# Altium schematic symbol library 13-Analog D 数模模数.SchLib: 573 symbols (part 5 of 6)
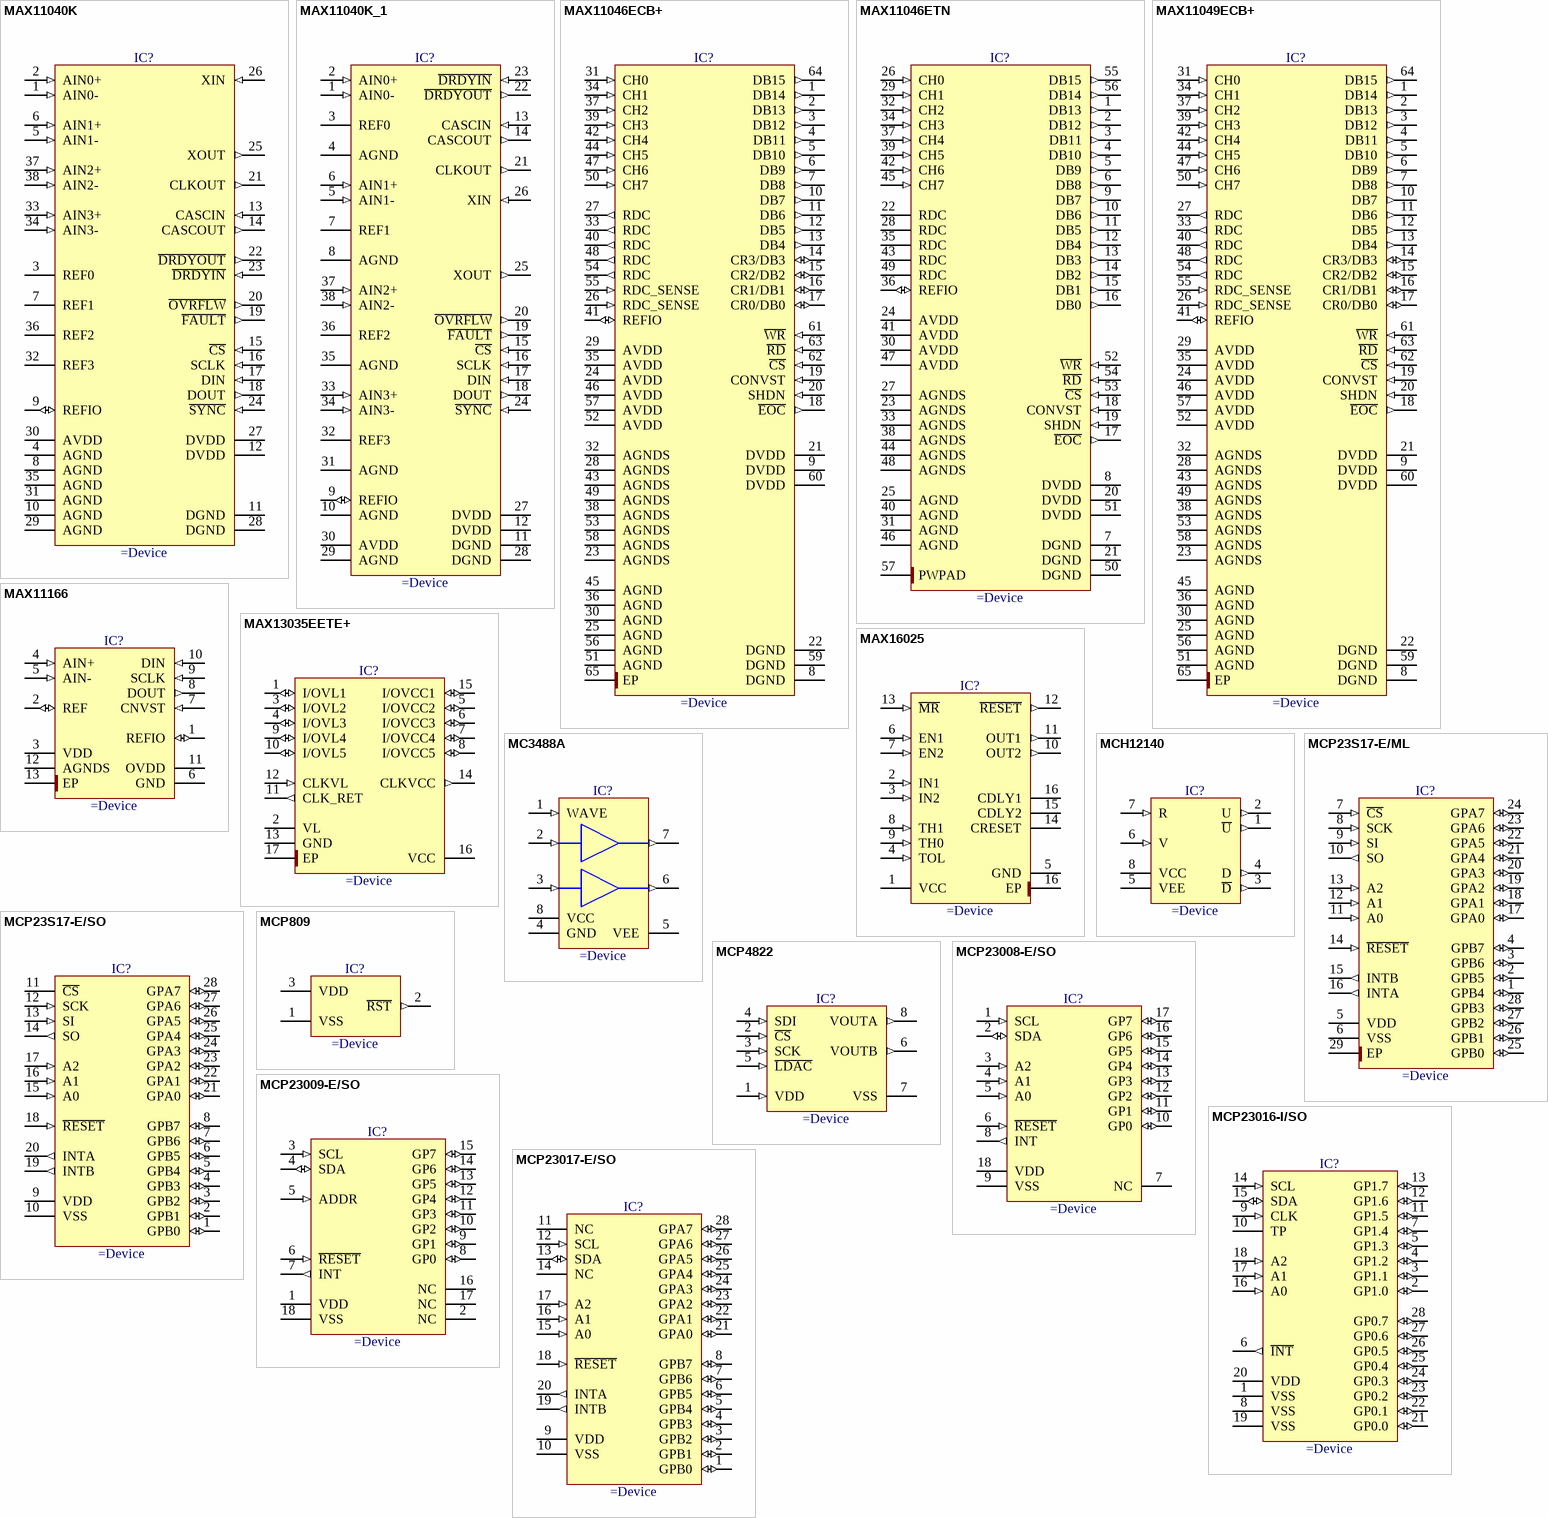
[diagram p44: symbols MAX11040K to MCP23017-E/SO]

## MAX11040K
designator IC?
24-Bit, 4-Channel, Simultaneous-Sampling, Cascadable, Sigma-Delta ADC
pins: 1 AIN0- (in), 2 AIN0+ (in), 3 REF0, 4 AGND (power), 5 AIN1- (in), 6 AIN1+ (in), 7 REF1, 8 AGND (power), 9 REFIO (io), 10 AGND (power), 11 DGND (power), 12 DVDD (power), 13 CASCIN (in), 14 CASCOUT (out), 15 ~{CS} (in), 16 SCLK (in), 17 DIN (in), 18 DOUT (out), 19 ~{FAULT} (out), 20 ~{OVRFLW} (out), 21 CLKOUT (out), 22 ~{DRDYOUT} (out), 23 ~{DRDYIN} (in), 24 ~{SYNC} (in), 25 XOUT (out), 26 XIN (in), 27 DVDD (power), 28 DGND (power), 29 AGND (power), 30 AVDD (power), 31 AGND (power), 32 REF3, 33 AIN3+ (in), 34 AIN3- (in), 35 AGND (power), 36 REF2, 37 AIN2+ (in), 38 AIN2- (in)

## MAX11040K_1
designator IC?
24-Bit, 4-Channel, Simultaneous-Sampling, Cascadable, Sigma-Delta ADC
pins: 1 AIN0- (in), 2 AIN0+ (in), 3 REF0, 4 AGND (power), 5 AIN1- (in), 6 AIN1+ (in), 7 REF1, 8 AGND (power), 9 REFIO (io), 10 AGND (power), 11 DGND (power), 12 DVDD (power), 13 CASCIN (in), 14 CASCOUT (out), 15 ~{CS} (in), 16 SCLK (in), 17 DIN (in), 18 DOUT (out), 19 ~{FAULT} (out), 20 ~{OVRFLW} (out), 21 CLKOUT (out), 22 ~{DRDYOUT} (out), 23 ~{DRDYIN} (in), 24 ~{SYNC} (in), 25 XOUT (out), 26 XIN (in), 27 DVDD (power), 28 DGND (power), 29 AGND (power), 30 AVDD (power), 31 AGND (power), 32 REF3, 33 AIN3+ (in), 34 AIN3- (in), 35 AGND (power), 36 REF2, 37 AIN2+ (in), 38 AIN2- (in)

## MAX11046ECB+
designator IC?
8-Channel, 16-Bit, Simultaneous-Sampling ADC
pins: 1 DB14 (out), 2 DB13 (out), 3 DB12 (out), 4 DB11 (out), 5 DB10 (out), 6 DB9 (out), 7 DB8 (out), 8 DGND (power), 9 DVDD (power), 10 DB7 (out), 11 DB6 (out), 12 DB5 (out), 13 DB4 (out), 14 CR3/DB3 (io), 15 CR2/DB2 (io), 16 CR1/DB1 (io), 17 CR0/DB0 (io), 18 ~{EOC} (out), 19 CONVST (in), 20 SHDN (in), 21 DVDD (power), 22 DGND (power), 23 AGNDS (power), 24 AVDD (power), 25 AGND (power), 26 RDC_SENSE (in), 27 RDC (out), 28 AGNDS (power), 29 AVDD (power), 30 AGND (power), 31 CH0 (in), 32 AGNDS (power), 33 RDC (out), 34 CH1 (in), 35 AVDD (power), 36 AGND (power), 37 CH2 (in), 38 AGNDS (power), 39 CH3 (in), 40 RDC (out), 41 REFIO (io), 42 CH4 (in), 43 AGNDS (power), 44 CH5 (in), 45 AGND (power), 46 AVDD (power), 47 CH6 (in), 48 RDC (out), 49 AGNDS (power), 50 CH7 (in), 51 AGND (power), 52 AVDD (power), 53 AGNDS (power), 54 RDC (out), 55 RDC_SENSE (in), 56 AGND (power), 57 AVDD (power), 58 AGNDS (power), 59 DGND (power), 60 DVDD (power), 61 ~{WR} (in), 62 ~{CS} (in), 63 ~{RD} (in), 64 DB15 (out), 65 EP (power)

## MAX11046ETN
designator IC?
8-Channel, 16-Bit, Simultaneous-Sampling ADC
pins: 1 DB13 (out), 2 DB12 (out), 3 DB11 (out), 4 DB10 (out), 5 DB9 (out), 6 DB8 (out), 7 DGND (power), 8 DVDD (power), 9 DB7 (out), 10 DB6 (out), 11 DB5 (out), 12 DB4 (out), 13 DB3 (out), 14 DB2 (out), 15 DB1 (out), 16 DB0 (out), 17 ~{EOC} (out), 18 CONVST (in), 19 SHDN (in), 20 DVDD (power), 21 DGND (power), 22 RDC, 23 AGNDS (power), 24 AVDD (power), 25 AGND (power), 26 CH0 (in), 27 AGNDS (power), 28 RDC, 29 CH1 (in), 30 AVDD (power), 31 AGND (power), 32 CH2 (in), 33 AGNDS (power), 34 CH3 (in), 35 RDC, 36 REFIO (io), 37 CH4 (in), 38 AGNDS (power), 39 CH5 (in), 40 AGND (power), 41 AVDD (power), 42 CH6 (in), 43 RDC, 44 AGNDS (power), 45 CH7 (in), 46 AGND (power), 47 AVDD (power), 48 AGNDS (power), 49 RDC, 50 DGND (power), 51 DVDD (power), 52 ~{WR} (in), 53 ~{CS} (in), 54 ~{RD} (in), 55 DB15 (out), 56 DB14 (out), 57 PWPAD (power)

## MAX11049ECB+
designator IC?
8-Channel, 16-Bit, Simultaneous-Sampling ADC
pins: 1 DB14 (out), 2 DB13 (out), 3 DB12 (out), 4 DB11 (out), 5 DB10 (out), 6 DB9 (out), 7 DB8 (out), 8 DGND (power), 9 DVDD (power), 10 DB7 (out), 11 DB6 (out), 12 DB5 (out), 13 DB4 (out), 14 CR3/DB3 (io), 15 CR2/DB2 (io), 16 CR1/DB1 (io), 17 CR0/DB0 (io), 18 ~{EOC} (out), 19 CONVST (in), 20 SHDN (in), 21 DVDD (power), 22 DGND (power), 23 AGNDS (power), 24 AVDD (power), 25 AGND (power), 26 RDC_SENSE (in), 27 RDC (out), 28 AGNDS (power), 29 AVDD (power), 30 AGND (power), 31 CH0 (in), 32 AGNDS (power), 33 RDC (out), 34 CH1 (in), 35 AVDD (power), 36 AGND (power), 37 CH2 (in), 38 AGNDS (power), 39 CH3 (in), 40 RDC (out), 41 REFIO (io), 42 CH4 (in), 43 AGNDS (power), 44 CH5 (in), 45 AGND (power), 46 AVDD (power), 47 CH6 (in), 48 RDC (out), 49 AGNDS (power), 50 CH7 (in), 51 AGND (power), 52 AVDD (power), 53 AGNDS (power), 54 RDC (out), 55 RDC_SENSE (in), 56 AGND (power), 57 AVDD (power), 58 AGNDS (power), 59 DGND (power), 60 DVDD (power), 61 ~{WR} (in), 62 ~{CS} (in), 63 ~{RD} (in), 64 DB15 (out), 65 EP (power)

## MAX11166
designator IC?
16-Bit, 500ksps/250ksps, ±5V SAR ADCs with Internal Reference
pins: 1 REFIO (io), 2 REF (io), 3 VDD (power), 4 AIN+ (in), 5 AIN- (in), 6 GND (power), 7 CNVST (in), 8 DOUT (out), 9 SCLK (in), 10 DIN (in), 11 OVDD (power), 12 AGNDS (power), 13 EP (power)

## MAX13035EETE+
designator IC?
6-Channel High-Speed Logic-Level Translator
pins: 1 I/OVL1 (io), 2 VL (power), 3 I/OVL2 (io), 4 I/OVL3 (io), 5 I/OVCC2 (io), 6 I/OVCC3 (io), 7 I/OVCC4 (io), 8 I/OVCC5 (io), 9 I/OVL4 (io), 10 I/OVL5 (io), 11 CLK_RET (out), 12 CLKVL (in), 13 GND (power), 14 CLKVCC (out), 15 I/OVCC1 (io), 16 VCC (power), 17 EP (power)

## MAX16025
designator IC?
Dual-Voltage, Capacitor-Adjustable, Sequencing/Supervisory Circuit
pins: 1 VCC (power), 2 IN1 (in), 3 IN2 (in), 4 TOL (in), 5 GND (power), 6 EN1 (in), 7 EN2 (in), 8 TH1 (in), 9 TH0 (in), 10 OUT2 (out), 11 OUT1 (out), 12 ~{RESET} (out), 13 ~{MR} (in), 14 CRESET, 15 CDLY2, 16 EP (power), 16 CDLY1

## MC3488A
designator IC?
Dual EIA-423/EIA-232D Line Driver
pins: 1 WAVE (in), 2 INA (in), 3 INB (in), 4 GND (power), 5 VEE (power), 6 OUTB (out), 7 OUTA (out), 8 VCC (power)

## MCH12140
designator IC?
Phase-Frequency Detector
pins: 1 ~{U} (out), 2 U (out), 3 ~{D} (out), 4 D (out), 5 VEE (power), 6 V (in), 7 R (in), 8 VCC (power)

## MCP23S17-E/ML
designator IC?
16-bit I/O Port Expander With Serial Interface
pins: 1 GPB4 (io), 2 GPB5 (io), 3 GPB6 (io), 4 GPB7 (io), 5 VDD (power), 6 VSS (power), 7 ~{CS} (in), 8 SCK (in), 9 SI (in), 10 SO (out), 11 A0 (in), 12 A1 (in), 13 A2 (in), 14 ~{RESET} (in), 15 INTB (out), 16 INTA (out), 17 GPA0 (io), 18 GPA1 (io), 19 GPA2 (io), 20 GPA3 (io), 21 GPA4 (io), 22 GPA5 (io), 23 GPA6 (io), 24 GPA7 (io), 25 GPB0 (io), 26 GPB1 (io), 27 GPB2 (io), 28 GPB3 (io), 29 EP (power)

## MCP23S17-E/SO
designator IC?
16-Bit I/O Expander with Serial Interface
pins: 1 GPB0 (io), 2 GPB1 (io), 3 GPB2 (io), 4 GPB3 (io), 5 GPB4 (io), 6 GPB5 (io), 7 GPB6 (io), 8 GPB7 (io), 9 VDD (power), 10 VSS (power), 11 ~{CS}, 12 SCK (in), 13 SI (in), 14 SO (out), 15 A0 (in), 16 A1 (in), 17 A2 (in), 18 ~{RESET} (in), 19 INTB (out), 20 INTA (out), 21 GPA0 (io), 22 GPA1 (io), 23 GPA2 (io), 24 GPA3 (io), 25 GPA4 (io), 26 GPA5 (io), 27 GPA6 (io), 28 GPA7 (io)

## MCP809
designator IC?
3.075V Microcontroller Supervisory Circuit With Push-Pull Output
pins: 1 VSS (power), 2 ~{RST} (out), 3 VDD (power)

## MCP4822
designator IC?
12-Bit Dual Voltage Output Digital-to-Analog Converter with Internal VREF and SPI Interface
pins: 1 VDD (in), 2 ~{CS} (in), 3 SCK (in), 4 SDI (in), 5 ~{LDAC} (in), 6 VOUTB (out), 7 VSS (power), 8 VOUTA (out)

## MCP23008-E/SO
designator IC?
8-Bit I/O Expander with Serial Interface
pins: 1 SCL (in), 2 SDA (io), 3 A2 (in), 4 A1 (in), 5 A0 (in), 6 ~{RESET} (in), 7 NC, 8 INT (out), 9 VSS (power), 10 GP0 (io), 11 GP1 (io), 12 GP2 (io), 13 GP3 (io), 14 GP4 (io), 15 GP5 (io), 16 GP6 (io), 17 GP7 (io), 18 VDD (power)

## MCP23009-E/SO
designator IC?
8-Bit I/O Expander with Open-Drain Outputs
pins: 1 VDD (power), 2 NC, 3 SCL (in), 4 SDA (io), 5 ADDR (in), 6 ~{RESET} (in), 7 INT (out), 8 GP0 (io), 9 GP1 (io), 10 GP2 (io), 11 GP3 (io), 12 GP4 (io), 13 GP5 (io), 14 GP6 (io), 15 GP7 (io), 16 NC, 17 NC, 18 VSS (power)

## MCP23016-I/SO
designator IC?
16-bit I/O I2C I/O Expander
pins: 1 VSS (power), 2 GP1.0 (io), 3 GP1.1 (io), 4 GP1.2 (io), 5 GP1.3 (io), 6 ~{INT} (out), 7 GP1.4 (io), 8 VSS (power), 9 CLK (in), 10 TP, 11 GP1.5 (io), 12 GP1.6 (io), 13 GP1.7 (io), 14 SCL (in), 15 SDA (io), 16 A0 (in), 17 A1 (in), 18 A2 (in), 19 VSS (power), 20 VDD (power), 21 GP0.0 (io), 22 GP0.1 (io), 23 GP0.2 (io), 24 GP0.3 (io), 25 GP0.4 (io), 26 GP0.5 (io), 27 GP0.6 (io), 28 GP0.7 (io)

## MCP23017-E/SO
designator IC?
16-Bit I/O Expander with Serial Interface
pins: 1 GPB0 (io), 2 GPB1 (io), 3 GPB2 (io), 4 GPB3 (io), 5 GPB4 (io), 6 GPB5 (io), 7 GPB6 (io), 8 GPB7 (io), 9 VDD (power), 10 VSS (power), 11 NC, 12 SCL (in), 13 SDA (io), 14 NC, 15 A0 (in), 16 A1 (in), 17 A2 (in), 18 ~{RESET} (in), 19 INTB (out), 20 INTA (out), 21 GPA0 (io), 22 GPA1 (io), 23 GPA2 (io), 24 GPA3 (io), 25 GPA4 (io), 26 GPA5 (io), 27 GPA6 (io), 28 GPA7 (io)

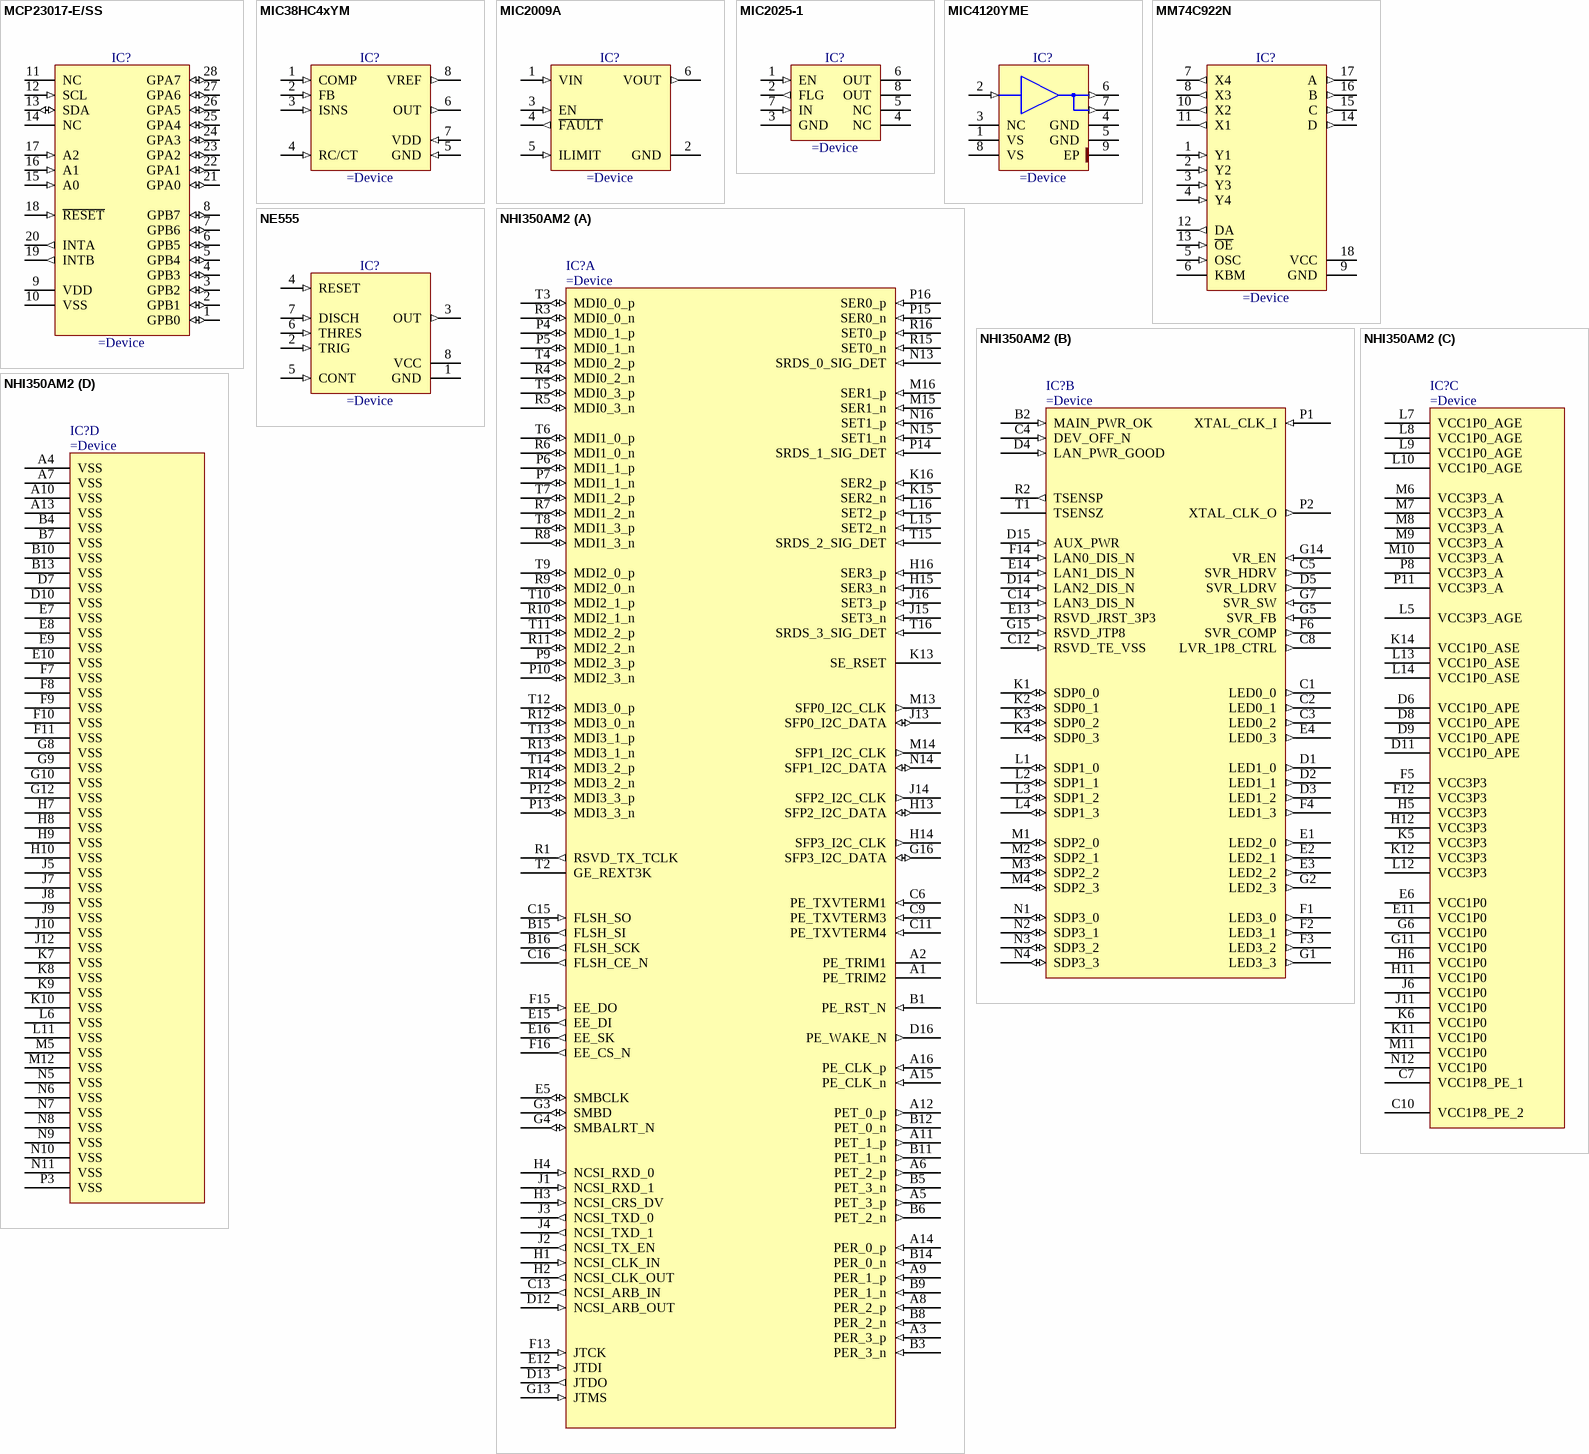
[diagram p29: symbols MCP23017-E/SS to NHI350AM2]

## MCP23017-E/SS
designator IC?
16-bit I/O Port Expander With Serial Interface
pins: 1 GPB0 (io), 2 GPB1 (io), 3 GPB2 (io), 4 GPB3 (io), 5 GPB4 (io), 6 GPB5 (io), 7 GPB6 (io), 8 GPB7 (io), 9 VDD (power), 10 VSS (power), 11 NC, 12 SCL (in), 13 SDA (io), 14 NC, 15 A0 (in), 16 A1 (in), 17 A2 (in), 18 ~{RESET} (in), 19 INTB (out), 20 INTA (out), 21 GPA0 (io), 22 GPA1 (io), 23 GPA2 (io), 24 GPA3 (io), 25 GPA4 (io), 26 GPA5 (io), 27 GPA6 (io), 28 GPA7 (io)

## MIC38HC4xYM
designator IC?
BiCMOS 1A Current-Mode PWM Controllers
pins: 1 COMP (in), 2 FB (in), 3 ISNS (in), 4 RC/CT (in), 5 GND (in), 6 OUT (out), 7 VDD (in), 8 VREF (out)

## MIC2009A
designator IC?
Adjustable Current Limiting Power Distribution Switches
pins: 1 VIN (in), 2 GND (power), 3 EN (in), 4 ~{FAULT} (out), 5 ILIMIT (in), 6 VOUT (out)

## MIC2025-1
designator IC?
Single-Channel Power Distribution Switch MM8®
pins: 1 EN (in), 2 FLG (out), 3 GND (power), 4 NC, 5 NC, 6 OUT (power), 7 IN (in), 8 OUT (power)

## MIC4120YME
designator IC?
6A Peak Low-Side MOSFET Driver, Non-Inverting Outputs
pins: 1 VS (power), 2 IN (in), 3 NC, 4 GND (power), 5 GND (power), 6 OUT (out), 7 OUT (out), 8 VS (power), 9 EP (power)

## MM74C922N
designator IC?
16-Key Encoder
pins: 1 Y1 (in), 2 Y2 (in), 3 Y3 (in), 4 Y4 (in), 5 OSC (in), 6 KBM, 7 X4 (out), 8 X3 (out), 9 GND (power), 10 X2 (out), 11 X1 (out), 12 DA (out), 13 ~{OE} (in), 14 D (out), 15 C (out), 16 B (out), 17 A (out), 18 VCC (power)

## NE555
designator IC?
Precision Timer
pins: 1 GND (power), 2 TRIG (in), 3 OUT (out), 4 RESET (in), 5 CONT (in), 6 THRES (in), 7 DISCH (in), 8 VCC (power)

## NHI350AM2
designator IC?
Ethernet Controller I350
part A pins: A1 PE_TRIM2, A2 PE_TRIM1, A3 PER_3_p (in), A5 PET_3_p (out), A6 PET_2_p (out), A8 PER_2_p (in), A9 PER_1_p (in), A11 PET_1_p (out), A12 PET_0_p (out), A14 PER_0_p (in), A15 PE_CLK_n (in), A16 PE_CLK_p (in), B1 PE_RST_N (in), B3 PER_3_n (in), B5 PET_3_n (out), B6 PET_2_n (out), B8 PER_2_n (in), B9 PER_1_n (in), B11 PET_1_n (out), B12 PET_0_n (out), B14 PER_0_n (in), B15 FLSH_SI (out), B16 FLSH_SCK (out), C6 PE_TXVTERM1 (in), C9 PE_TXVTERM3 (in), C11 PE_TXVTERM4 (in), C13 NCSI_ARB_IN (out), C15 FLSH_SO (in), C16 FLSH_CE_N (out), D12 NCSI_ARB_OUT (in), D13 JTDO (out), D16 PE_WAKE_N (out), E5 SMBCLK (io), E12 JTDI (in), E15 EE_DI (out), E16 EE_SK (out), F13 JTCK (in), F15 EE_DO (in), F16 EE_CS_N (out), G3 SMBD (io), G4 SMBALRT_N (io), G13 JTMS (in), G16 SFP3_I2C_DATA (io), H1 NCSI_CLK_IN (in), H2 NCSI_CLK_OUT (out), H3 NCSI_CRS_DV (in), H4 NCSI_RXD_0 (in), H13 SFP2_I2C_DATA (io), H14 SFP3_I2C_CLK (out), H15 SER3_n (in), H16 SER3_p (in), J1 NCSI_RXD_1 (in), J2 NCSI_TX_EN (out), J3 NCSI_TXD_0 (out), J4 NCSI_TXD_1 (out), J13 SFP0_I2C_DATA (io), J14 SFP2_I2C_CLK (out), J15 SET3_n (in), J16 SET3_p (in), K13 SE_RSET, K15 SER2_n (in), K16 SER2_p (in), L15 SET2_n (in), L16 SET2_p (in), M13 SFP0_I2C_CLK (out), M14 SFP1_I2C_CLK (out), M15 SER1_n (in), M16 SER1_p (in), N13 SRDS_0_SIG_DET (in), N14 SFP1_I2C_DATA (io), N15 SET1_n (in), N16 SET1_p (in), P4 MDI0_1_p (io), P5 MDI0_1_n (io), P6 MDI1_1_p (io), P7 MDI1_1_n (io), P9 MDI2_3_p (io), P10 MDI2_3_n (io), P12 MDI3_3_p (io), P13 MDI3_3_n (io), P14 SRDS_1_SIG_DET (in), P15 SER0_n (in), P16 SER0_p (in), R1 RSVD_TX_TCLK (out), R3 MDI0_0_n (io), R4 MDI0_2_n (io), R5 MDI0_3_n (io), R6 MDI1_0_n (io), R7 MDI1_2_n (io), R8 MDI1_3_n (io), R9 MDI2_0_n (io), R10 MDI2_1_n (io), R11 MDI2_2_n (io), R12 MDI3_0_n (io), R13 MDI3_1_n (io), R14 MDI3_2_n (io), R15 SET0_n (in), R16 SET0_p (in), T2 GE_REXT3K, T3 MDI0_0_p (io), T4 MDI0_2_p (io), T5 MDI0_3_p (io), T6 MDI1_0_p (io), T7 MDI1_2_p (io), T8 MDI1_3_p (io), T9 MDI2_0_p (io), T10 MDI2_1_p (io), T11 MDI2_2_p (io), T12 MDI3_0_p (io), T13 MDI3_1_p (io), T14 MDI3_2_p (io), T15 SRDS_2_SIG_DET (in), T16 SRDS_3_SIG_DET (in)
part B pins: B2 MAIN_PWR_OK (in), C1 LED0_0 (out), C2 LED0_1 (out), C3 LED0_2 (out), C4 DEV_OFF_N (in), C5 SVR_HDRV (out), C8 LVR_1P8_CTRL (out), C12 RSVD_TE_VSS (in), C14 LAN3_DIS_N (in), D1 LED1_0 (out), D2 LED1_1 (out), D3 LED1_2 (out), D4 LAN_PWR_GOOD (in), D5 SVR_LDRV (out), D14 LAN2_DIS_N (in), D15 AUX_PWR (in), E1 LED2_0 (out), E2 LED2_1 (out), E3 LED2_2 (out), E4 LED0_3 (out), E13 RSVD_JRST_3P3 (in), E14 LAN1_DIS_N (in), F1 LED3_0 (out), F2 LED3_1 (out), F3 LED3_2 (out), F4 LED1_3 (out), F6 SVR_COMP (out), F14 LAN0_DIS_N (in), G1 LED3_3 (out), G2 LED2_3 (out), G5 SVR_FB (in), G7 SVR_SW (in), G14 VR_EN (in), G15 RSVD_JTP8 (in), K1 SDP0_0 (io), K2 SDP0_1 (io), K3 SDP0_2 (io), K4 SDP0_3 (io), L1 SDP1_0 (io), L2 SDP1_1 (io), L3 SDP1_2 (io), L4 SDP1_3 (io), M1 SDP2_0 (io), M2 SDP2_1 (io), M3 SDP2_2 (io), M4 SDP2_3 (io), N1 SDP3_0 (io), N2 SDP3_1 (io), N3 SDP3_2 (io), N4 SDP3_3 (io), P1 XTAL_CLK_I (in), P2 XTAL_CLK_O (out), R2 TSENSP (out), T1 TSENSZ (power)
part C pins: C7 VCC1P8_PE_1 (power), C10 VCC1P8_PE_2 (power), D6 VCC1P0_APE (power), D8 VCC1P0_APE (power), D9 VCC1P0_APE (power), D11 VCC1P0_APE (power), E6 VCC1P0 (power), E11 VCC1P0 (power), F5 VCC3P3 (power), F12 VCC3P3 (power), G6 VCC1P0 (power), G11 VCC1P0 (power), H5 VCC3P3 (power), H6 VCC1P0 (power), H11 VCC1P0 (power), H12 VCC3P3 (power), J6 VCC1P0 (power), J11 VCC1P0 (power), K5 VCC3P3 (power), K6 VCC1P0 (power), K11 VCC1P0 (power), K12 VCC3P3 (power), K14 VCC1P0_ASE (power), L5 VCC3P3_AGE (power), L7 VCC1P0_AGE (power), L8 VCC1P0_AGE (power), L9 VCC1P0_AGE (power), L10 VCC1P0_AGE (power), L12 VCC3P3 (power), L13 VCC1P0_ASE (power), L14 VCC1P0_ASE (power), M6 VCC3P3_A (power), M7 VCC3P3_A (power), M8 VCC3P3_A (power), M9 VCC3P3_A (power), M10 VCC3P3_A (power), M11 VCC1P0 (power), N12 VCC1P0 (power), P8 VCC3P3_A (power), P11 VCC3P3_A (power)
part D pins: A4 VSS (power), A7 VSS (power), A10 VSS (power), A13 VSS (power), B4 VSS (power), B7 VSS (power), B10 VSS (power), B13 VSS (power), D7 VSS (power), D10 VSS (power), E7 VSS (power), E8 VSS (power), E9 VSS (power), E10 VSS (power), F7 VSS (power), F8 VSS (power), F9 VSS (power), F10 VSS (power), F11 VSS (power), G8 VSS (power), G9 VSS (power), G10 VSS (power), G12 VSS (power), H7 VSS (power), H8 VSS (power), H9 VSS (power), H10 VSS (power), J5 VSS (power), J7 VSS (power), J8 VSS (power), J9 VSS (power), J10 VSS (power), J12 VSS (power), K7 VSS (power), K8 VSS (power), K9 VSS (power), K10 VSS (power), L6 VSS (power), L11 VSS (power), M5 VSS (power), M12 VSS (power), N5 VSS (power), N6 VSS (power), N7 VSS (power), N8 VSS (power), N9 VSS (power), N10 VSS (power), N11 VSS (power), P3 VSS (power)

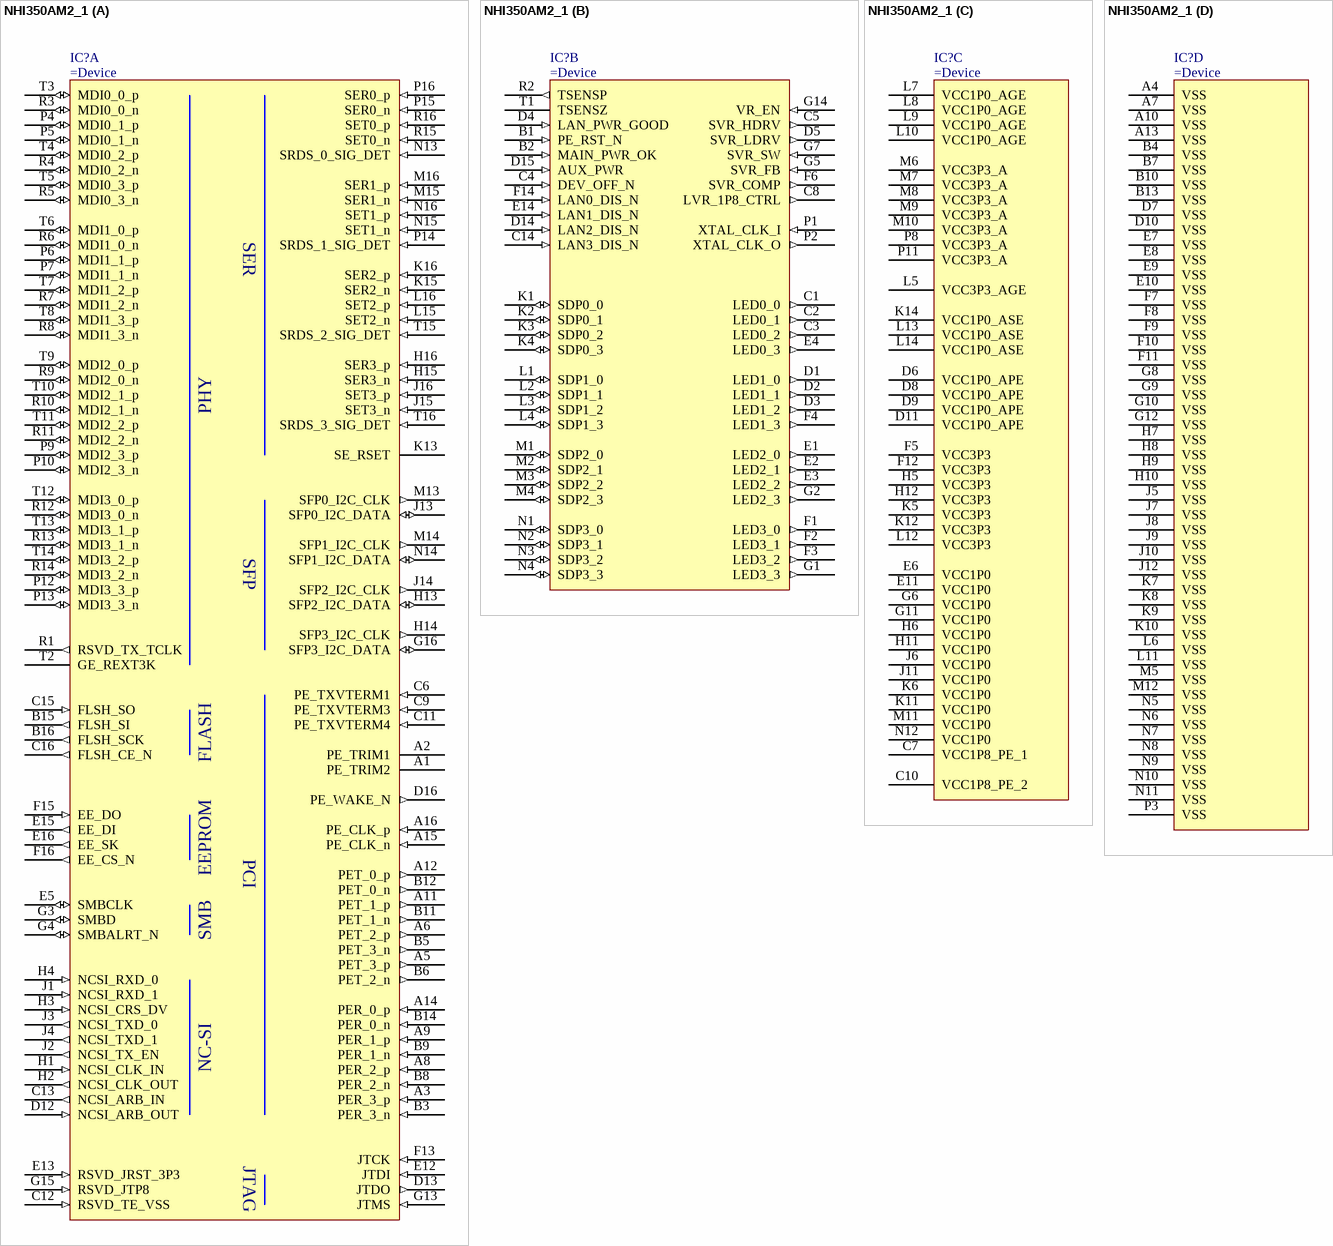
[diagram p30: symbol NHI350AM2_1]

## NHI350AM2_1
designator IC?
Ethernet Controller I350
part A pins: A1 PE_TRIM2, A2 PE_TRIM1, A3 PER_3_p (in), A5 PET_3_p (out), A6 PET_2_p (out), A8 PER_2_p (in), A9 PER_1_p (in), A11 PET_1_p (out), A12 PET_0_p (out), A14 PER_0_p (in), A15 PE_CLK_n (in), A16 PE_CLK_p (in), B3 PER_3_n (in), B5 PET_3_n (out), B6 PET_2_n (out), B8 PER_2_n (in), B9 PER_1_n (in), B11 PET_1_n (out), B12 PET_0_n (out), B14 PER_0_n (in), B15 FLSH_SI (out), B16 FLSH_SCK (out), C6 PE_TXVTERM1 (in), C9 PE_TXVTERM3 (in), C11 PE_TXVTERM4 (in), C12 RSVD_TE_VSS (in), C13 NCSI_ARB_IN (out), C15 FLSH_SO (in), C16 FLSH_CE_N (out), D12 NCSI_ARB_OUT (in), D13 JTDO (out), D16 PE_WAKE_N (out), E5 SMBCLK (io), E12 JTDI (in), E13 RSVD_JRST_3P3 (in), E15 EE_DI (out), E16 EE_SK (out), F13 JTCK (in), F15 EE_DO (in), F16 EE_CS_N (out), G3 SMBD (io), G4 SMBALRT_N (io), G13 JTMS (in), G15 RSVD_JTP8 (in), G16 SFP3_I2C_DATA (io), H1 NCSI_CLK_IN (in), H2 NCSI_CLK_OUT (out), H3 NCSI_CRS_DV (in), H4 NCSI_RXD_0 (in), H13 SFP2_I2C_DATA (io), H14 SFP3_I2C_CLK (out), H15 SER3_n (in), H16 SER3_p (in), J1 NCSI_RXD_1 (in), J2 NCSI_TX_EN (out), J3 NCSI_TXD_0 (out), J4 NCSI_TXD_1 (out), J13 SFP0_I2C_DATA (io), J14 SFP2_I2C_CLK (out), J15 SET3_n (in), J16 SET3_p (in), K13 SE_RSET, K15 SER2_n (in), K16 SER2_p (in), L15 SET2_n (in), L16 SET2_p (in), M13 SFP0_I2C_CLK (out), M14 SFP1_I2C_CLK (out), M15 SER1_n (in), M16 SER1_p (in), N13 SRDS_0_SIG_DET (in), N14 SFP1_I2C_DATA (io), N15 SET1_n (in), N16 SET1_p (in), P4 MDI0_1_p (io), P5 MDI0_1_n (io), P6 MDI1_1_p (io), P7 MDI1_1_n (io), P9 MDI2_3_p (io), P10 MDI2_3_n (io), P12 MDI3_3_p (io), P13 MDI3_3_n (io), P14 SRDS_1_SIG_DET (in), P15 SER0_n (in), P16 SER0_p (in), R1 RSVD_TX_TCLK (out), R3 MDI0_0_n (io), R4 MDI0_2_n (io), R5 MDI0_3_n (io), R6 MDI1_0_n (io), R7 MDI1_2_n (io), R8 MDI1_3_n (io), R9 MDI2_0_n (io), R10 MDI2_1_n (io), R11 MDI2_2_n (io), R12 MDI3_0_n (io), R13 MDI3_1_n (io), R14 MDI3_2_n (io), R15 SET0_n (in), R16 SET0_p (in), T2 GE_REXT3K, T3 MDI0_0_p (io), T4 MDI0_2_p (io), T5 MDI0_3_p (io), T6 MDI1_0_p (io), T7 MDI1_2_p (io), T8 MDI1_3_p (io), T9 MDI2_0_p (io), T10 MDI2_1_p (io), T11 MDI2_2_p (io), T12 MDI3_0_p (io), T13 MDI3_1_p (io), T14 MDI3_2_p (io), T15 SRDS_2_SIG_DET (in), T16 SRDS_3_SIG_DET (in)
part B pins: B1 PE_RST_N (in), B2 MAIN_PWR_OK (in), C1 LED0_0 (out), C2 LED0_1 (out), C3 LED0_2 (out), C4 DEV_OFF_N (in), C5 SVR_HDRV (out), C8 LVR_1P8_CTRL (out), C14 LAN3_DIS_N (in), D1 LED1_0 (out), D2 LED1_1 (out), D3 LED1_2 (out), D4 LAN_PWR_GOOD (in), D5 SVR_LDRV (out), D14 LAN2_DIS_N (in), D15 AUX_PWR (in), E1 LED2_0 (out), E2 LED2_1 (out), E3 LED2_2 (out), E4 LED0_3 (out), E14 LAN1_DIS_N (in), F1 LED3_0 (out), F2 LED3_1 (out), F3 LED3_2 (out), F4 LED1_3 (out), F6 SVR_COMP (out), F14 LAN0_DIS_N (in), G1 LED3_3 (out), G2 LED2_3 (out), G5 SVR_FB (in), G7 SVR_SW (in), G14 VR_EN (in), K1 SDP0_0 (io), K2 SDP0_1 (io), K3 SDP0_2 (io), K4 SDP0_3 (io), L1 SDP1_0 (io), L2 SDP1_1 (io), L3 SDP1_2 (io), L4 SDP1_3 (io), M1 SDP2_0 (io), M2 SDP2_1 (io), M3 SDP2_2 (io), M4 SDP2_3 (io), N1 SDP3_0 (io), N2 SDP3_1 (io), N3 SDP3_2 (io), N4 SDP3_3 (io), P1 XTAL_CLK_I (in), P2 XTAL_CLK_O (out), R2 TSENSP (out), T1 TSENSZ (power)
part C pins: C7 VCC1P8_PE_1 (power), C10 VCC1P8_PE_2 (power), D6 VCC1P0_APE (power), D8 VCC1P0_APE (power), D9 VCC1P0_APE (power), D11 VCC1P0_APE (power), E6 VCC1P0 (power), E11 VCC1P0 (power), F5 VCC3P3 (power), F12 VCC3P3 (power), G6 VCC1P0 (power), G11 VCC1P0 (power), H5 VCC3P3 (power), H6 VCC1P0 (power), H11 VCC1P0 (power), H12 VCC3P3 (power), J6 VCC1P0 (power), J11 VCC1P0 (power), K5 VCC3P3 (power), K6 VCC1P0 (power), K11 VCC1P0 (power), K12 VCC3P3 (power), K14 VCC1P0_ASE (power), L5 VCC3P3_AGE (power), L7 VCC1P0_AGE (power), L8 VCC1P0_AGE (power), L9 VCC1P0_AGE (power), L10 VCC1P0_AGE (power), L12 VCC3P3 (power), L13 VCC1P0_ASE (power), L14 VCC1P0_ASE (power), M6 VCC3P3_A (power), M7 VCC3P3_A (power), M8 VCC3P3_A (power), M9 VCC3P3_A (power), M10 VCC3P3_A (power), M11 VCC1P0 (power), N12 VCC1P0 (power), P8 VCC3P3_A (power), P11 VCC3P3_A (power)
part D pins: A4 VSS (power), A7 VSS (power), A10 VSS (power), A13 VSS (power), B4 VSS (power), B7 VSS (power), B10 VSS (power), B13 VSS (power), D7 VSS (power), D10 VSS (power), E7 VSS (power), E8 VSS (power), E9 VSS (power), E10 VSS (power), F7 VSS (power), F8 VSS (power), F9 VSS (power), F10 VSS (power), F11 VSS (power), G8 VSS (power), G9 VSS (power), G10 VSS (power), G12 VSS (power), H7 VSS (power), H8 VSS (power), H9 VSS (power), H10 VSS (power), J5 VSS (power), J7 VSS (power), J8 VSS (power), J9 VSS (power), J10 VSS (power), J12 VSS (power), K7 VSS (power), K8 VSS (power), K9 VSS (power), K10 VSS (power), L6 VSS (power), L11 VSS (power), M5 VSS (power), M12 VSS (power), N5 VSS (power), N6 VSS (power), N7 VSS (power), N8 VSS (power), N9 VSS (power), N10 VSS (power), N11 VSS (power), P3 VSS (power)
part A text: SER; PHY; SFP; FLASH; EEPROM; PCI; SMB; NC-SI; JTAG

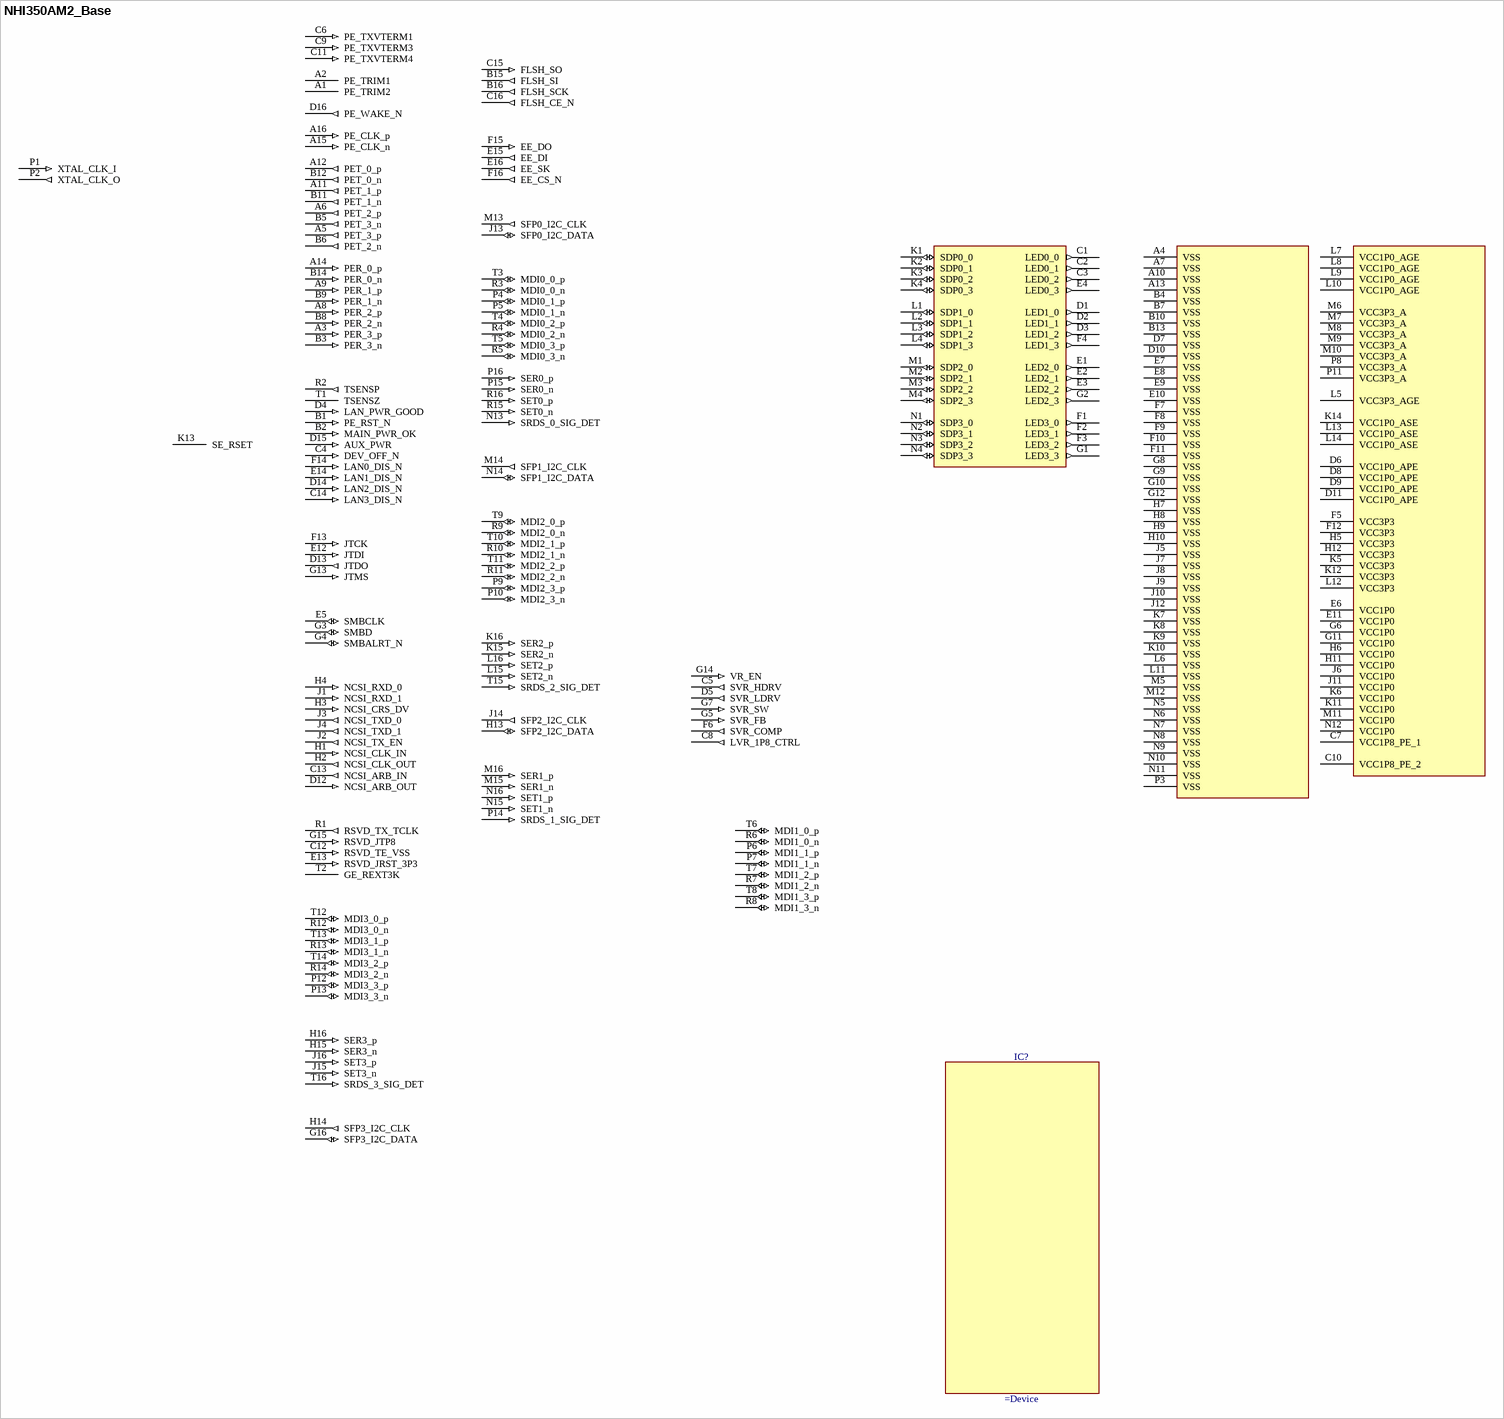
[diagram p31: symbol NHI350AM2_Base]

## NHI350AM2_Base
designator IC?
Ethernet Controller I350
pins: A1 PE_TRIM2, A2 PE_TRIM1, A3 PER_3_p (in), A4 VSS (power), A5 PET_3_p (out), A6 PET_2_p (out), A7 VSS (power), A8 PER_2_p (in), A9 PER_1_p (in), A10 VSS (power), A11 PET_1_p (out), A12 PET_0_p (out), A13 VSS (power), A14 PER_0_p (in), A15 PE_CLK_n (in), A16 PE_CLK_p (in), B1 PE_RST_N (in), B2 MAIN_PWR_OK (in), B3 PER_3_n (in), B4 VSS (power), B5 PET_3_n (out), B6 PET_2_n (out), B7 VSS (power), B8 PER_2_n (in), B9 PER_1_n (in), B10 VSS (power), B11 PET_1_n (out), B12 PET_0_n (out), B13 VSS (power), B14 PER_0_n (in), B15 FLSH_SI (out), B16 FLSH_SCK (out), C1 LED0_0 (out), C2 LED0_1 (out), C3 LED0_2 (out), C4 DEV_OFF_N (in), C5 SVR_HDRV (out), C6 PE_TXVTERM1 (in), C7 VCC1P8_PE_1 (power), C8 LVR_1P8_CTRL (out), C9 PE_TXVTERM3 (in), C10 VCC1P8_PE_2 (power), C11 PE_TXVTERM4 (in), C12 RSVD_TE_VSS (in), C13 NCSI_ARB_IN (out), C14 LAN3_DIS_N (in), C15 FLSH_SO (in), C16 FLSH_CE_N (out), D1 LED1_0 (out), D2 LED1_1 (out), D3 LED1_2 (out), D4 LAN_PWR_GOOD (in), D5 SVR_LDRV (out), D6 VCC1P0_APE (power), D7 VSS (power), D8 VCC1P0_APE (power), D9 VCC1P0_APE (power), D10 VSS (power), D11 VCC1P0_APE (power), D12 NCSI_ARB_OUT (in), D13 JTDO (out), D14 LAN2_DIS_N (in), D15 AUX_PWR (in), D16 PE_WAKE_N (out), E1 LED2_0 (out), E2 LED2_1 (out), E3 LED2_2 (out), E4 LED0_3 (out), E5 SMBCLK (io), E6 VCC1P0 (power), E7 VSS (power), E8 VSS (power), E9 VSS (power), E10 VSS (power), E11 VCC1P0 (power), E12 JTDI (in), E13 RSVD_JRST_3P3 (in), E14 LAN1_DIS_N (in), E15 EE_DI (out), E16 EE_SK (out), F1 LED3_0 (out), F2 LED3_1 (out), F3 LED3_2 (out), F4 LED1_3 (out), F5 VCC3P3 (power), F6 SVR_COMP (out), F7 VSS (power), F8 VSS (power), F9 VSS (power), F10 VSS (power), F11 VSS (power), F12 VCC3P3 (power), F13 JTCK (in), F14 LAN0_DIS_N (in), F15 EE_DO (in), F16 EE_CS_N (out), G1 LED3_3 (out), G2 LED2_3 (out), G3 SMBD (io), G4 SMBALRT_N (io), G5 SVR_FB (in), G6 VCC1P0 (power), G7 SVR_SW (in), G8 VSS (power), G9 VSS (power), G10 VSS (power), G11 VCC1P0 (power), G12 VSS (power), G13 JTMS (in), G14 VR_EN (in), G15 RSVD_JTP8 (in), G16 SFP3_I2C_DATA (io), H1 NCSI_CLK_IN (in), H2 NCSI_CLK_OUT (out), H3 NCSI_CRS_DV (in), H4 NCSI_RXD_0 (in), H5 VCC3P3 (power), H6 VCC1P0 (power), H7 VSS (power), H8 VSS (power), H9 VSS (power), H10 VSS (power), H11 VCC1P0 (power), H12 VCC3P3 (power), H13 SFP2_I2C_DATA (io), H14 SFP3_I2C_CLK (out), H15 SER3_n (in), H16 SER3_p (in), J1 NCSI_RXD_1 (in), J2 NCSI_TX_EN (out), J3 NCSI_TXD_0 (out), J4 NCSI_TXD_1 (out), J5 VSS (power), J6 VCC1P0 (power), J7 VSS (power), J8 VSS (power), J9 VSS (power), J10 VSS (power), J11 VCC1P0 (power), J12 VSS (power), J13 SFP0_I2C_DATA (io), J14 SFP2_I2C_CLK (out), J15 SET3_n (in), J16 SET3_p (in), K1 SDP0_0 (io), K2 SDP0_1 (io), K3 SDP0_2 (io), K4 SDP0_3 (io), K5 VCC3P3 (power), K6 VCC1P0 (power), K7 VSS (power), K8 VSS (power), K9 VSS (power), K10 VSS (power), K11 VCC1P0 (power), K12 VCC3P3 (power), K13 SE_RSET, K14 VCC1P0_ASE (power), K15 SER2_n (in), K16 SER2_p (in), L1 SDP1_0 (io), L2 SDP1_1 (io), L3 SDP1_2 (io), L4 SDP1_3 (io), L5 VCC3P3_AGE (power), L6 VSS (power), L7 VCC1P0_AGE (power), L8 VCC1P0_AGE (power), L9 VCC1P0_AGE (power), L10 VCC1P0_AGE (power), L11 VSS (power), L12 VCC3P3 (power), L13 VCC1P0_ASE (power), L14 VCC1P0_ASE (power), L15 SET2_n (in), L16 SET2_p (in), M1 SDP2_0 (io), M2 SDP2_1 (io), M3 SDP2_2 (io), M4 SDP2_3 (io), M5 VSS (power), M6 VCC3P3_A (power), M7 VCC3P3_A (power), M8 VCC3P3_A (power), M9 VCC3P3_A (power), M10 VCC3P3_A (power), M11 VCC1P0 (power), M12 VSS (power), M13 SFP0_I2C_CLK (out), M14 SFP1_I2C_CLK (out), M15 SER1_n (in), M16 SER1_p (in), N1 SDP3_0 (io), N2 SDP3_1 (io), N3 SDP3_2 (io), N4 SDP3_3 (io), N5 VSS (power), N6 VSS (power), N7 VSS (power), N8 VSS (power), N9 VSS (power), N10 VSS (power), N11 VSS (power), N12 VCC1P0 (power), N13 SRDS_0_SIG_DET (in), N14 SFP1_I2C_DATA (io), N15 SET1_n (in), N16 SET1_p (in), P1 XTAL_CLK_I (in), P2 XTAL_CLK_O (out), P3 VSS (power), P4 MDI0_1_p (io), P5 MDI0_1_n (io), P6 MDI1_1_p (io), P7 MDI1_1_n (io), P8 VCC3P3_A (power), P9 MDI2_3_p (io), P10 MDI2_3_n (io), P11 VCC3P3_A (power), P12 MDI3_3_p (io), P13 MDI3_3_n (io), P14 SRDS_1_SIG_DET (in), P15 SER0_n (in), P16 SER0_p (in), R1 RSVD_TX_TCLK (out), R2 TSENSP (out), R3 MDI0_0_n (io), R4 MDI0_2_n (io), R5 MDI0_3_n (io), R6 MDI1_0_n (io), R7 MDI1_2_n (io), R8 MDI1_3_n (io), R9 MDI2_0_n (io), R10 MDI2_1_n (io), R11 MDI2_2_n (io), R12 MDI3_0_n (io), R13 MDI3_1_n (io), R14 MDI3_2_n (io), R15 SET0_n (in), R16 SET0_p (in), T1 TSENSZ (power), T2 GE_REXT3K, T3 MDI0_0_p (io), T4 MDI0_2_p (io), T5 MDI0_3_p (io), T6 MDI1_0_p (io), T7 MDI1_2_p (io), T8 MDI1_3_p (io), T9 MDI2_0_p (io), T10 MDI2_1_p (io), T11 MDI2_2_p (io), T12 MDI3_0_p (io), T13 MDI3_1_p (io), T14 MDI3_2_p (io), T15 SRDS_2_SIG_DET (in), T16 SRDS_3_SIG_DET (in)
